# Altium footprint library Watch Max.PcbLib: 66 footprints (part 2 of 5)
Each footprint in its own frame and in the unit in brackets; x right, y up, seen from the top. Pads: shape width x height; smd on the part's side, far side on the other; paste and mask are expansions set on the pad; w line width, h text height; cw(c..) or ccw(c..) is an arc to the next point about the centre after c.
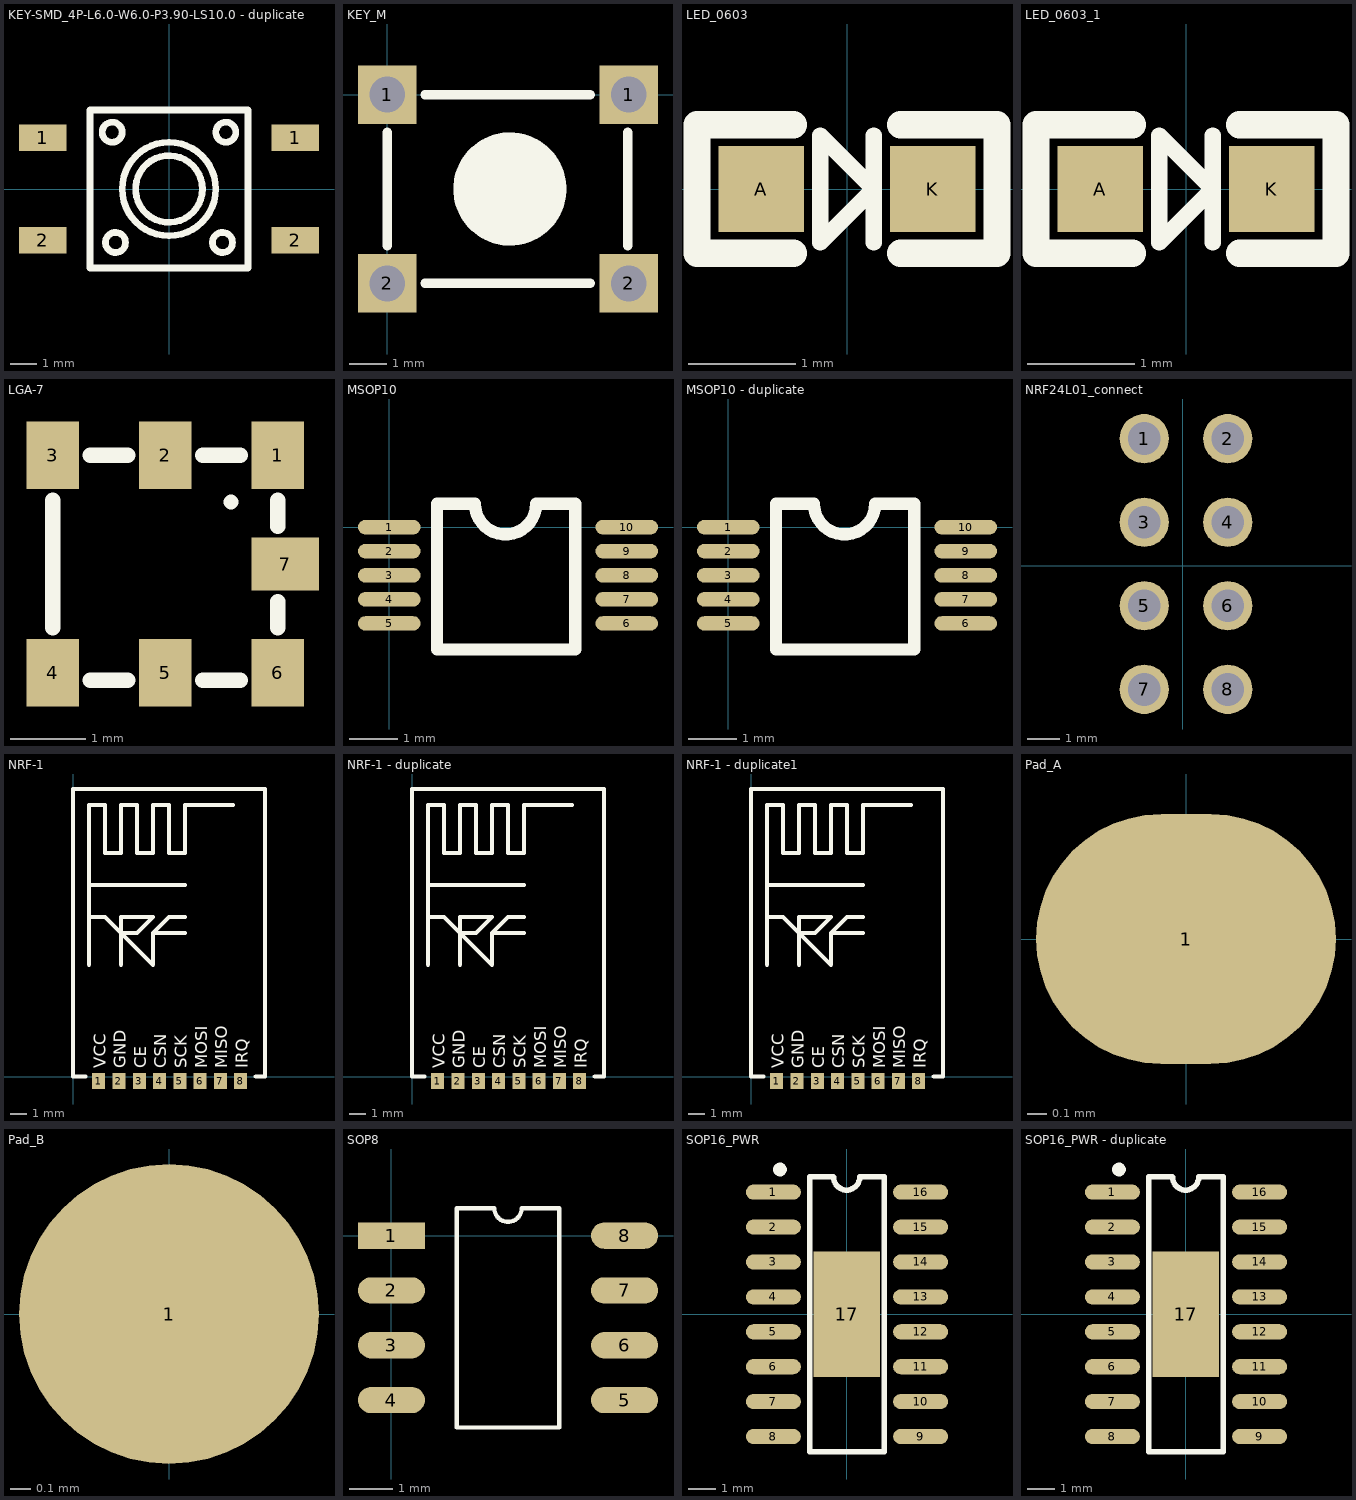
[diagram p1: the footprints below, top view; thin cyan lines are the x and y axes]

## KEY-SMD_4P-L6.0-W6.0-P3.90-LS10.0 - duplicate [mm]
pads (4):
  rect 1.8x1 smd: 1(-4.8,1.95) 1(4.8,1.95) 2(-4.8,-1.95) 2(4.8,-1.95)
Top Overlay:
  circle w0.254: c0,0 r1.27
  circle w0.254: c0,0 r1.778
  circle w0.254: c2.032,-2.032 r0.381
  circle w0.254: c-2.032,-2.032 r0.381
  circle w0.254: c2.159,2.159 r0.381
  circle w0.254: c-2.159,2.159 r0.381
  lines w0.254: -3,-3 3,-3 3,3 -3,3 -3,-3

## KEY_M [mil]
pads (4):
  rect 62x62 hole 38: 1(0,0) 1(255.91,0) 2(0,-200) 2(255.91,-200)
Top Overlay:
  circle w60: c130,-100 r30
  lines w10: -0.03,-160 -0.03,-40 ; 39.97,-200 215,-200 ; 39.97,0 215,0 ; 255,-160 255,-40
3D body "Push Tactile Button .stp": height 157.48, standoff -137.76, extent -26.56,-219.52 276.61,16.71

## LED_0603 [mm]
pads (2):
  rect 0.8x0.8 smd paste-0.1: A(-0.8,0) K(0.8,0)
Top Overlay:
  lines w0.152: 0.25,-0.5 0.25,0.5 ; -0.25,-0.5 0.25,0 -0.25,0.5 -0.25,-0.5
  lines w0.254: -0.5,-0.6 -1.4,-0.6 -1.4,0.6 -0.5,0.6 ; 0.5,-0.6 1.4,-0.6 1.4,0.6 0.5,0.6
3D body "User Library-led_0603.STEP": height 0.6, standoff 0, extent -0.8,-0.4 0.82,0.4

## LED_0603_1 [mm]
pads (2):
  rect 0.8x0.8 smd paste-0.1: A(-0.8,0) K(0.8,0)
Top Overlay:
  lines w0.152: 0.25,-0.5 0.25,0.5 ; -0.25,-0.5 -0.25,0.5 0.25,0 -0.25,-0.5
  lines w0.254: -0.5,-0.6 -1.4,-0.6 -1.4,0.6 -0.5,0.6 ; 0.5,-0.6 1.4,-0.6 1.4,0.6 0.5,0.6
3D body "User Library-led_0603.STEP": height 0.6, standoff 0, extent -0.8,-0.4 0.82,0.4

## LGA-7 [mm] "LGA-7Pin"
pads (7):
  rect 0.7x0.9 smd: 1(-1,5) 2(-2.5,5) 3(-4,5) 4(-4,2.1) 5(-2.5,2.1) 6(-1,2.1)
  rect 0.9x0.7 smd: 7(-0.9,3.55)
Top Overlay:
  lines w0.203: -4,2.7 -4,4.4 ; -3.5,2 -3,2 ; -3.5,5 -3,5 ; -2,2 -1.5,2 ; -2,5 -1.5,5 ; -1,2.7 -1,3.05 ; -1,4.05 -1,4.4 ; -1.625,4.375 -1.625,4.375

## MSOP10 [mm] "VSOP8"
height 5
pads (10):
  oval 1.3x0.3 smd: 1(0,0) 2(0,-0.5) 3(0,-1) 4(0,-1.5) 5(0,-2) 6(4.928,-2) 7(4.928,-1.5) 8(4.928,-1) 9(4.928,-0.5) 10(4.928,0)
Top Overlay:
  lines w0.254: 0.991,-2.54 3.861,-2.54 3.861,0.483 3.048,0.483 cw(c2.413,0.483) 1.778,0.483 0.991,0.483 0.991,-2.54
3D body "MSOP10-1.step": height 1.09, standoff 0, extent -0.111,-2.616 5.039,0.584

## MSOP10 - duplicate [mm] "VSOP8"
height 5
pads (10):
  oval 1.3x0.3 smd: 1(0,0) 2(0,-0.5) 3(0,-1) 4(0,-1.5) 5(0,-2) 6(4.928,-2) 7(4.928,-1.5) 8(4.928,-1) 9(4.928,-0.5) 10(4.928,0)
Top Overlay:
  lines w0.254: 0.991,-2.54 3.861,-2.54 3.861,0.483 3.048,0.483 cw(c2.413,0.483) 1.778,0.483 0.991,0.483 0.991,-2.54
3D body "MSOP10-1.step": height 1.09, standoff 0, extent -0.111,-2.616 5.039,0.584

## NRF24L01_connect [mm]
pads (8):
  round 1.5 hole 1: 1(-1.168,3.861) 2(1.372,3.861) 3(-1.168,1.321) 4(1.372,1.321) 5(-1.168,-1.219) 6(1.372,-1.219) 7(-1.168,-3.759) 8(1.372,-3.759)
3D body "nRF24L01+_enhanced.stp": height 3.8, standoff -9.05, extent -3.883,-7.144 25.117,7.856

## NRF-1 [mm]
pads (8):
  rect 0.813x1 smd: 1(1.6,-0.275) 2(2.87,-0.275) 3(4.14,-0.275) 4(5.41,-0.275) 5(6.68,-0.275) 6(7.95,-0.275) 7(9.22,-0.275) 8(10.49,-0.275)
Top Overlay:
  lines w0.254: 0.762,0 0,0 0,18 12,18 12,0 11.43,0 ; 1,7 1,11 ; 1,9 1,11 ; 1,10 2,10 3,9 ; 7,9 5,9 ; 7,10 6,10 5,9 ; 7,12 1,12 ; 10,17 8,17 7,17 7,14 6,14 6,17 5,17 5,14 4,14 4,17 3,17 3,14 2,14 2,17 1,17 1,12 ; 1,11 1,12 ; 3,9 3,7 3,9 ; 3,9 3,10 5,10 4,9 3,9 ; 3,9 5,7 5,9
  text "IRQ" at 10.922,0.508 h0.76
  text "MISO" at 9.652,0.508 h0.76
  text "MOSI" at 8.382,0.508 h0.76
  text "SCK" at 7.112,0.508 h0.76
  text "CSN" at 5.842,0.508 h0.76
  text "CE" at 4.572,0.508 h0.76
  text "GND" at 3.302,0.508 h0.76
  text "VCC" at 2.032,0.508 h0.76
3D body "nRF24L01+_SMD.stp": height 2.27, standoff 0, extent -0.006,-0.279 11.994,17.721

## NRF-1 - duplicate [mm]
pads (8):
  rect 0.813x1 smd: 1(1.6,-0.275) 2(2.87,-0.275) 3(4.14,-0.275) 4(5.41,-0.275) 5(6.68,-0.275) 6(7.95,-0.275) 7(9.22,-0.275) 8(10.49,-0.275)
Top Overlay:
  lines w0.254: 0.762,0 0,0 0,18 12,18 12,0 11.43,0 ; 1,7 1,11 ; 1,9 1,11 ; 1,10 2,10 3,9 ; 7,9 5,9 ; 7,10 6,10 5,9 ; 7,12 1,12 ; 10,17 8,17 7,17 7,14 6,14 6,17 5,17 5,14 4,14 4,17 3,17 3,14 2,14 2,17 1,17 1,12 ; 1,11 1,12 ; 3,9 5,7 5,9 ; 3,9 4,9 5,10 3,10 3,9 ; 3,9 3,7 3,9
  text "VCC" at 2.032,0.508 h0.76
  text "GND" at 3.302,0.508 h0.76
  text "CE" at 4.572,0.508 h0.76
  text "CSN" at 5.842,0.508 h0.76
  text "SCK" at 7.112,0.508 h0.76
  text "MOSI" at 8.382,0.508 h0.76
  text "MISO" at 9.652,0.508 h0.76
  text "IRQ" at 10.922,0.508 h0.76

## NRF-1 - duplicate1 [mm]
pads (8):
  rect 0.813x1 smd: 1(1.6,-0.275) 2(2.87,-0.275) 3(4.14,-0.275) 4(5.41,-0.275) 5(6.68,-0.275) 6(7.95,-0.275) 7(9.22,-0.275) 8(10.49,-0.275)
Top Overlay:
  lines w0.254: 0.762,0 0,0 0,18 12,18 12,0 11.43,0 ; 1,7 1,11 ; 1,9 1,11 ; 1,10 2,10 3,9 ; 7,9 5,9 ; 7,10 6,10 5,9 ; 7,12 1,12 ; 10,17 8,17 7,17 7,14 6,14 6,17 5,17 5,14 4,14 4,17 3,17 3,14 2,14 2,17 1,17 1,12 ; 1,11 1,12 ; 3,9 5,7 5,9 ; 3,9 4,9 5,10 3,10 3,9 ; 3,9 3,7 3,9
  text "VCC" at 2.032,0.508 h0.76
  text "GND" at 3.302,0.508 h0.76
  text "CE" at 4.572,0.508 h0.76
  text "CSN" at 5.842,0.508 h0.76
  text "SCK" at 7.112,0.508 h0.76
  text "MOSI" at 8.382,0.508 h0.76
  text "MISO" at 9.652,0.508 h0.76
  text "IRQ" at 10.922,0.508 h0.76

## Pad_A [mil]
pads (1):
  oval 60x50 smd: 1(0,0)

## Pad_B [mm]
pads (1):
  round 1.5 smd: 1(0,0)

## SOP8 [mil]
pads (8):
  rect 61x24 smd: 1(0,0)
  oval 61x24 smd: 2(0,-50) 3(0,-100) 4(0,-150) 5(212.6,-150) 6(212.6,-100) 7(212.6,-50) 8(212.6,0)
Top Overlay:
  lines w4: 59.5,-175 153.1,-175 153.1,25 118.8,25 cw(c106.3,25) 93.8,25 59.5,25 59.5,-175

## SOP16_PWR [mm] "SOP, 16-Leads, Body 9.90x3.90mm, Pitch 1.27mm, IPC Medium Density"
height 1.75
pads (17):
  oval 2x0.55 smd: 1(-2.667,4.445) 2(-2.667,3.175) 3(-2.667,1.905) 4(-2.667,0.635) 5(-2.667,-0.635) 6(-2.667,-1.905) 7(-2.667,-3.175) 8(-2.667,-4.445) 9(2.692,-4.445) 10(2.692,-3.175) 11(2.692,-1.905) 12(2.692,-0.635) 13(2.692,0.635) 14(2.692,1.905) 15(2.692,3.175) 16(2.692,4.445)
  rect 2.41x4.57 smd: 17(0,0)
Top Overlay:
  circle w0.25: c-2.425,5.27 r0.125
  lines w0.2: -0.483,5 -1.346,5 -1.346,-5 1.372,-5 1.372,5 0.475,5 ; -0.475,4.997 ccw(c0,4.996) 0.475,4.997
3D body "SO-16.step": height 1.45, standoff 0, extent -2.927,-4.978 2.978,5.004

## SOP16_PWR - duplicate [mm] "SOP, 16-Leads, Body 9.90x3.90mm, Pitch 1.27mm, IPC Medium Density"
height 1.75
pads (17):
  oval 2x0.55 smd: 1(-2.667,4.445) 2(-2.667,3.175) 3(-2.667,1.905) 4(-2.667,0.635) 5(-2.667,-0.635) 6(-2.667,-1.905) 7(-2.667,-3.175) 8(-2.667,-4.445) 9(2.692,-4.445) 10(2.692,-3.175) 11(2.692,-1.905) 12(2.692,-0.635) 13(2.692,0.635) 14(2.692,1.905) 15(2.692,3.175) 16(2.692,4.445)
  rect 2.41x4.57 smd: 17(0,0)
Top Overlay:
  circle w0.25: c-2.425,5.27 r0.125
  lines w0.2: -0.483,5 -1.346,5 -1.346,-5 1.372,-5 1.372,5 0.475,5 ; -0.475,4.997 ccw(c0,4.996) 0.475,4.997
3D body "SO-16.step": height 1.45, standoff 0, extent -2.927,-4.978 2.978,5.004